# Altium footprint library 我的元件库01.PcbLib: 321 footprints (part 14 of 21)
Each footprint in its own frame and in the unit in brackets; x right, y up, seen from the top. Pads: shape width x height; smd on the part's side, far side on the other; paste and mask are expansions set on the pad; w line width, h text height; cw(c..) or ccw(c..) is an arc to the next point about the centre after c.
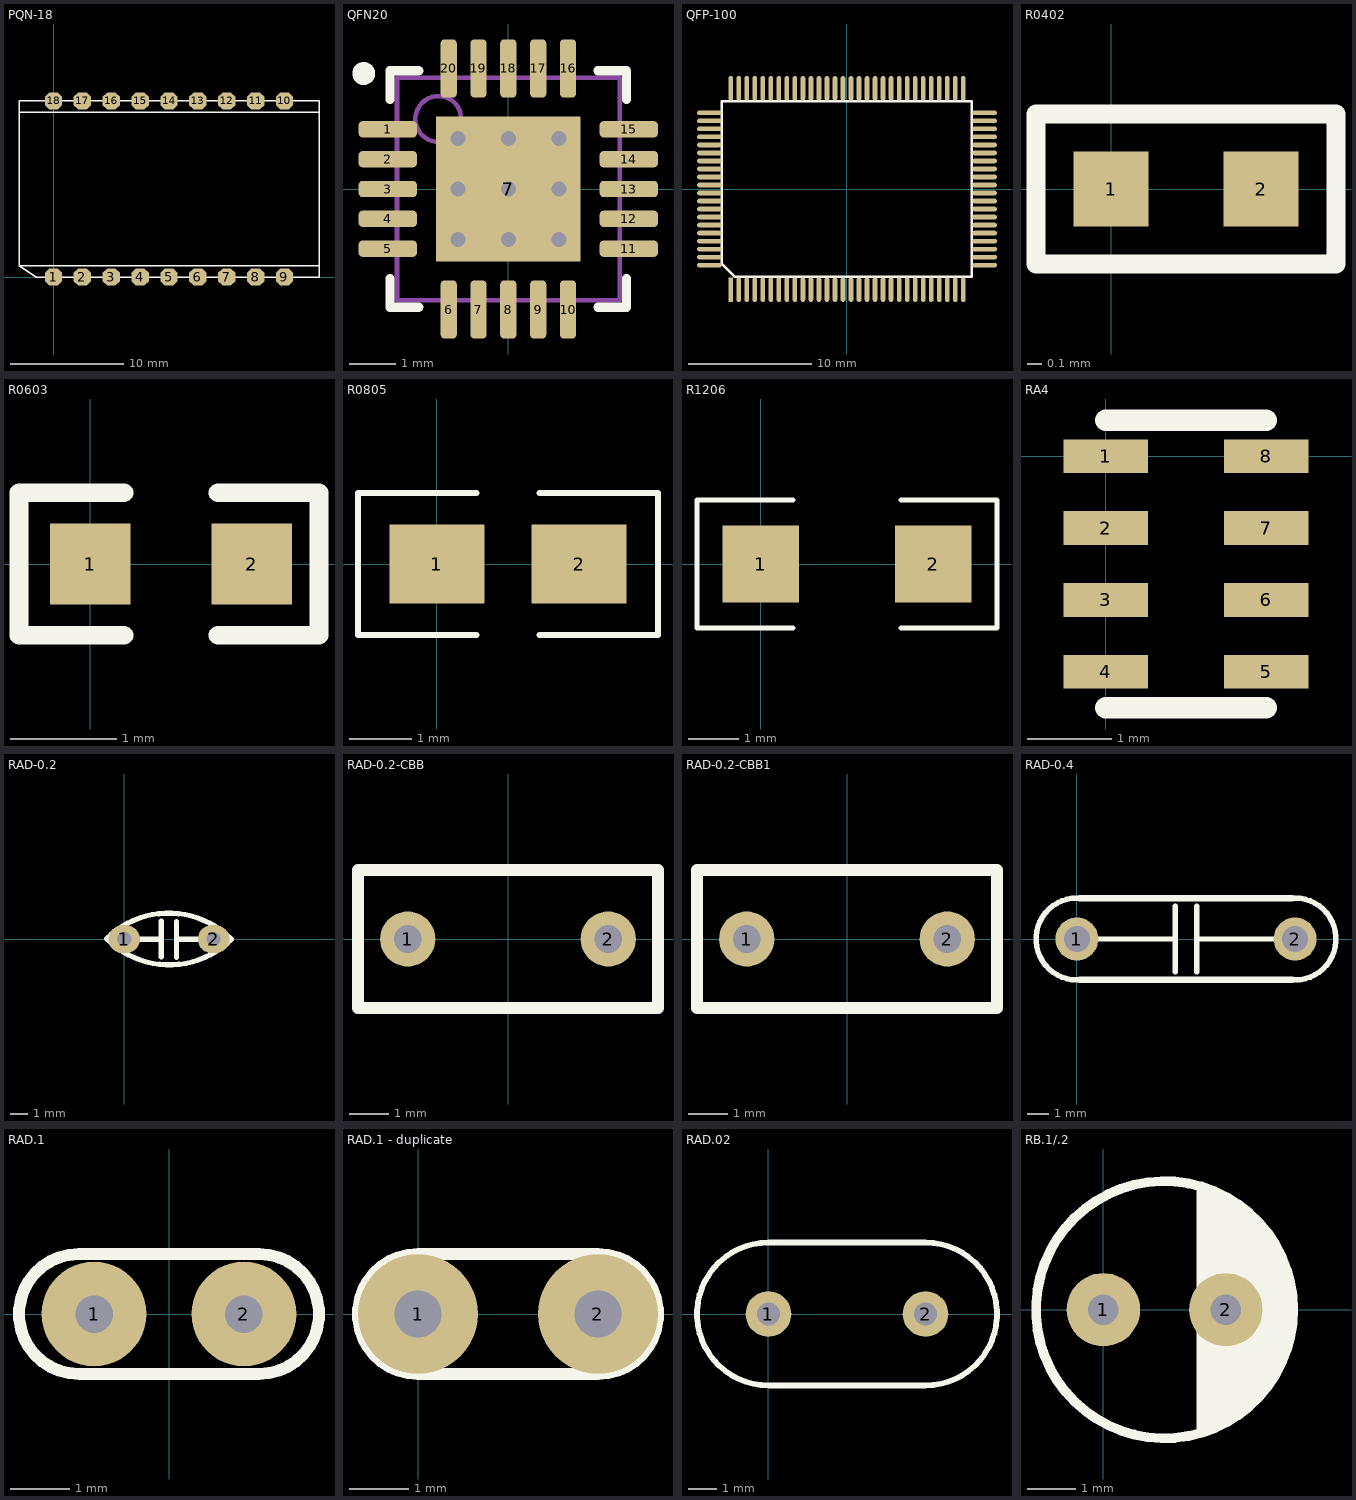
[diagram p13: the footprints below, top view; thin cyan lines are the x and y axes]

## PQN-18 [mil]
pads (18):
  oct 60x60 smd: 1(0.06,-0.22) 2(100.06,-0.22) 3(200.06,-0.22) 4(300.06,-0.22) 5(400.06,-0.22) 6(500.06,-0.22) 7(600.06,-0.22) 8(700.06,-0.22) 9(800.06,-0.22) 10(800.06,610.02) 11(700.06,610.02) 12(600.06,610.02) 13(500.06,610.02) 14(400.06,610.02) 15(300.06,610.02) 16(200.06,610.02) 17(100.06,610.02) 18(0.06,610.02)
Top Overlay:
  lines w5: -119.62,570.65 919.75,570.65 ; 919.75,39.15 -119.62,39.15 ; -119.62,39.15 -119.62,610.02 919.75,610.02 919.75,-0.22 -59.94,-0.22 -119.62,39.15

## QFN20 [mm] "QFN, 20-Leads, Body 5.00x5.00mm, Pitch 0.65mm, Thermal Pad 3.15x3.15mm, IPC Low Density"
height 0.8
pads (21):
  rrect50% 1.27x0.356 smd: 1(-2.625,1.3) 2(-2.625,0.65) 3(-2.625,0) 4(-2.625,-0.65) 5(-2.625,-1.3) 11(2.625,-1.3) 12(2.625,-0.65) 13(2.625,0) 14(2.625,0.65) 15(2.625,1.3)
  rrect50% 0.356x1.27 smd: 6(-1.3,-2.625) 7(-0.65,-2.625) 8(0,-2.625) 9(0.65,-2.625) 10(1.3,-2.625) 16(1.3,2.625) 17(0.65,2.625) 18(0,2.625) 19(-0.65,2.625) 20(-1.3,2.625)
  rect 3.15x3.15 smd: 7(0,0)
via 1.1,-1.1 diameter 0.66 hole 0.33
via 0,-1.1 diameter 0.66 hole 0.33
via -1.1,-1.1 diameter 0.66 hole 0.33
via 1.1,0 diameter 0.66 hole 0.33
via 0,0 diameter 0.66 hole 0.33
via -1.1,0 diameter 0.66 hole 0.33
via 1.1,1.1 diameter 0.66 hole 0.33
via 0,1.1 diameter 0.66 hole 0.33
via -1.1,1.1 diameter 0.66 hole 0.33
Top Overlay:
  circle w0.25: c-3.15,2.515 r0.125
  lines w0.2: -2.575,-1.95 -2.575,-2.575 -1.95,-2.575 ; -2.575,1.95 -2.575,2.575 -1.95,2.575 ; 1.95,-2.575 2.575,-2.575 2.575,-1.95 ; 1.95,2.575 2.575,2.575 2.575,1.95
Mechanical 13:
  circle w0.1: c-1.525,1.525 r0.5
  lines w0.1: -2.425,-2.425 2.425,-2.425 2.425,2.425 -2.425,2.425 -2.425,-2.425
Mechanical 15:
  lines w0.1: -0.5,0 0.5,0 ; 0,-0.5 0,0.5
3D body: height 0.8, standoff 0.05, extent -2.425,-2.425 2.425,2.425

## QFP-100 [mm]
pads (100):
  rect 0.381x2 smd: 1(-9.425,-8.16)
  oval 0.381x2 smd: 2(-8.775,-8.16) 3(-8.125,-8.16) 4(-7.475,-8.16) 5(-6.825,-8.16) 6(-6.175,-8.16) 7(-5.525,-8.16) 8(-4.875,-8.16) 9(-4.225,-8.16) 10(-3.575,-8.16) 11(-2.925,-8.16) 12(-2.275,-8.16) 13(-1.625,-8.16) 14(-0.975,-8.16) 15(-0.325,-8.16) 16(0.325,-8.16) 17(0.975,-8.16) 18(1.625,-8.16) 19(2.275,-8.16) 20(2.925,-8.16) 21(3.575,-8.16) 22(4.225,-8.16) 23(4.875,-8.16) 24(5.525,-8.16) 25(6.175,-8.16) 26(6.825,-8.16) 27(7.475,-8.16) 28(8.125,-8.16) 29(8.775,-8.16) 30(9.425,-8.16) 51(9.425,8.16) 52(8.775,8.16) 53(8.125,8.16) 54(7.475,8.16) 55(6.825,8.16) 56(6.175,8.16) 57(5.525,8.16) 58(4.875,8.16) 59(4.225,8.16) 60(3.575,8.16) 61(2.925,8.16) 62(2.275,8.16) 63(1.625,8.16) 64(0.975,8.16) 65(0.325,8.16) 66(-0.325,8.16) 67(-0.975,8.16) 68(-1.625,8.16) 69(-2.275,8.16) 70(-2.925,8.16) 71(-3.575,8.16) 72(-4.225,8.16) 73(-4.875,8.16) 74(-5.525,8.16) 75(-6.175,8.16) 76(-6.825,8.16) 77(-7.475,8.16) 78(-8.125,8.16) 79(-8.775,8.16) 80(-9.425,8.16)
  oval 2x0.381 smd: 31(11.16,-6.175) 32(11.16,-5.525) 33(11.16,-4.875) 34(11.16,-4.225) 35(11.16,-3.575) 36(11.16,-2.925) 37(11.16,-2.275) 38(11.16,-1.625) 39(11.16,-0.975) 40(11.16,-0.325) 41(11.16,0.325) 42(11.16,0.975) 43(11.16,1.625) 44(11.16,2.275) 45(11.16,2.925) 46(11.16,3.575) 47(11.16,4.225) 48(11.16,4.875) 49(11.16,5.525) 50(11.16,6.175) 81(-11.16,6.175) 82(-11.16,5.525) 83(-11.16,4.875) 84(-11.16,4.225) 85(-11.16,3.575) 86(-11.16,2.925) 87(-11.16,2.275) 88(-11.16,1.625) 89(-11.16,0.975) 90(-11.16,0.325) 91(-11.16,-0.325) 92(-11.16,-0.975) 93(-11.16,-1.625) 94(-11.16,-2.275) 95(-11.16,-2.925) 96(-11.16,-3.575) 97(-11.16,-4.225) 98(-11.16,-4.875) 99(-11.16,-5.525) 100(-11.16,-6.175)
Top Overlay:
  lines w0.2: -10.136,-6.084 -10.136,7.131 ; -10.13,-6.084 -9.095,-7.119 ; -10.125,7.125 10.125,7.125 10.125,-7.125 -9.09,-7.125
3D body "User Library-CY7C68013A-128AXC.STEP": height 1.6, standoff -0.05, extent -10.998,-7.994 10.997,8.001

## R0402 [mil]
pads (2):
  rect 20x20 smd: 1(0,0) 2(40,0)
Top Overlay:
  lines w5: -20,-20 60,-20 60,20 -20,20 -20,-20
3D body "R0402.STEP": height 13.78, standoff 0, extent 0.32,-10 39.69,9.69

## R0603 [mil]
pads (2):
  rect 30x30 smd: 1(0,0) 2(60,0)
Top Overlay:
  lines w7: -26.5,26.5 -26.5,-26.5 12.5,-26.5 ; -25,26.5 12.5,26.5 ; 47.5,-26.5 85,-26.5 85,26.5 47.5,26.5
3D body "R0603.STEP": height 17.72, standoff 0, extent -1,-16 61.99,15.5

## R0805 [mil]
pads (2):
  rect 60x50 smd: 1(0,0) 2(90,0)
Top Overlay:
  lines w3.94: 25,-45 -50,-45 -50,45 25,45 ; 65,-45 140,-45 140,45 65,45
3D body "R0805.STEP": height 21.65, standoff 0, extent 6,-25 84.74,24.61

## R1206 [mil]
pads (2):
  rect 60x60 smd: 1(0,0) 2(135,0)
Top Overlay:
  lines w3.94: 25,-50 -50,-50 -50,50 25,50 ; 110,-50 185,-50 185,50 110,50
3D body "R1206.STEP": height 23.62, standoff 0, extent 5,-31 130.98,31.99

## RA4 [mm]
pads (8):
  rect 1x0.4 smd: 1(0,0) 2(0,-0.85) 3(0,-1.7) 4(0,-2.55) 5(1.9,-2.55) 6(1.9,-1.7) 7(1.9,-0.85) 8(1.9,0)
Top Overlay:
  lines w0.254: 0,-2.975 1.9,-2.975 ; 0,0.425 1.9,0.425
3D body "User Library-YC164.STEP": height 0.55, standoff 0, extent 0.152,-2.87 1.752,0.33

## RAD-0.2 [mm]
pads (2):
  oval 1.8x1.6 hole 0.8: 1(0,0) 2(5.08,0)
Top Overlay:
  lines w0.3: -1.008,0.02 cw(c2.528,-3.516) 6.063,0.02 ; -0.975,0 ccw(c2.56,3.536) 6.096,0 ; 0,0 2.032,0 ; 2.108,-1.016 2.108,1.016 ; 2.976,-1.041 2.976,0.991 ; 2.976,0 5.08,0
Bottom Overlay:
  lines w0.3: 1.016,0 2.032,0 ; 2.108,-1.016 2.108,1.016 ; 2.976,-1.041 2.976,0.991 ; 2.976,0 4.03,0
3D body "SW3dPS-Panasonic ECK-A3D102KBP.STEP": height 4.16, standoff -9.03, extent -1.486,-1.173 6.515,1.219

## RAD-0.2-CBB [mm]
pads (2):
  round 1.4 hole 0.7: 1(-2.54,0) 2(2.54,0)
Top Overlay:
  lines w0.305: -3.8,-1.75 3.8,-1.75 3.8,1.75 -3.8,1.75 -3.8,-1.75
3D body "User Library-100n.STEP": height 8.11, standoff -4.09, extent -3.699,-1.245 3.801,1.255

## RAD-0.2-CBB1 [mm]
pads (2):
  round 1.4 hole 0.7: 1(-2.54,0) 2(2.54,0)
Top Overlay:
  lines w0.305: -3.8,-1.75 -3.8,1.75 3.8,1.75 3.8,-1.75 -3.8,-1.75
3D body "User Library-WIMA Capacitor.STEP": height 1.5, standoff -7.5, extent -3.6,-1.219 3.6,1.281

## RAD-0.4 [mm]
pads (2):
  round 2 hole 1.2: 1(0,0) 2(10.16,0)
Top Overlay:
  lines w0.254: 0,-1.905 cw(c0,0) 0,1.905 ; 1.016,0 4.572,0 ; 4.572,-1.524 4.572,1.524 ; 5.588,-1.524 5.588,1.524 ; 5.588,0 9.144,0 ; 10.16,-1.905 ccw(c10.16,0) 10.16,1.905
  lines w0.305: 0.127,-1.905 10.033,-1.905 ; 0.127,1.905 10.033,1.905
3D body "User Library-RAD CAP 18_5MM.STEP": height 17.16, standoff -9.33, extent -4.352,-3.48 14.148,3.32

## RAD.1 [mil]
pads (2):
  round 70 hole 25: 1(-50,0) 2(50,0)
Top Overlay:
  lines w8: -60,-40 cw(c-60,0) -60,40 60,40 cw(c60,0) 60,-40 -60,-40

## RAD.1 - duplicate [mil]
pads (2):
  round 80 hole 31.5: 1(0,0) 2(120,0)
Top Overlay:
  lines w8: 0,-40 cw(c0,0) 0,40 120,40 cw(c120,0) 120,-40 0,-40

## RAD.02 [mm]
pads (2):
  round 1.6 hole 0.8: 1(0,0) 2(5.5,0)
Top Overlay:
  lines w0.2: 0,-2.5 cw(c0,0) 0,2.5 5.5,2.5 cw(c5.5,0) 5.5,-2.5 0,-2.5

## RB.1/.2 [mil]
pads (2):
  round 60 hole 25: 1(0,0) 2(100,0)
Top Overlay:
  circle w8: c50,0 r105
  lines w8: 80,-100 80,100 ; 85,-95 85,95 ; 90,-90 90,95 ; 95,-90 95,90 ; 100,-90 100,85 ; 100,-85 110,-85 ; 105,-80 105,80 ; 105,85 110,80 110,-80 ; 115,-75 115,75 ; 120,-70 120,70 ; 125,-65 125,65 ; 130,-60 130,65 ; 130,-55 135,-55 ; 135,-50 135,50 135,55 ; 140,-45 140,45 ; 145,-35 145,35 ; 150,-25 150,20
Bottom Overlay:
  lines w8: 70,0 75,0
3D body "SW3dPS-Cap electro 5x11x2mm.STEP": height 453.76, standoff -128.81, extent -50.43,-99 148.43,99.85